# Altium footprint library TranDangKhoa-LIB.PcbLib: 1435 footprints (part 59 of 90)
Each footprint in its own frame and in the unit in brackets; x right, y up, seen from the top. Pads: shape width x height; smd on the part's side, far side on the other; paste and mask are expansions set on the pad; w line width, h text height; cw(c..) or ccw(c..) is an arc to the next point about the centre after c.
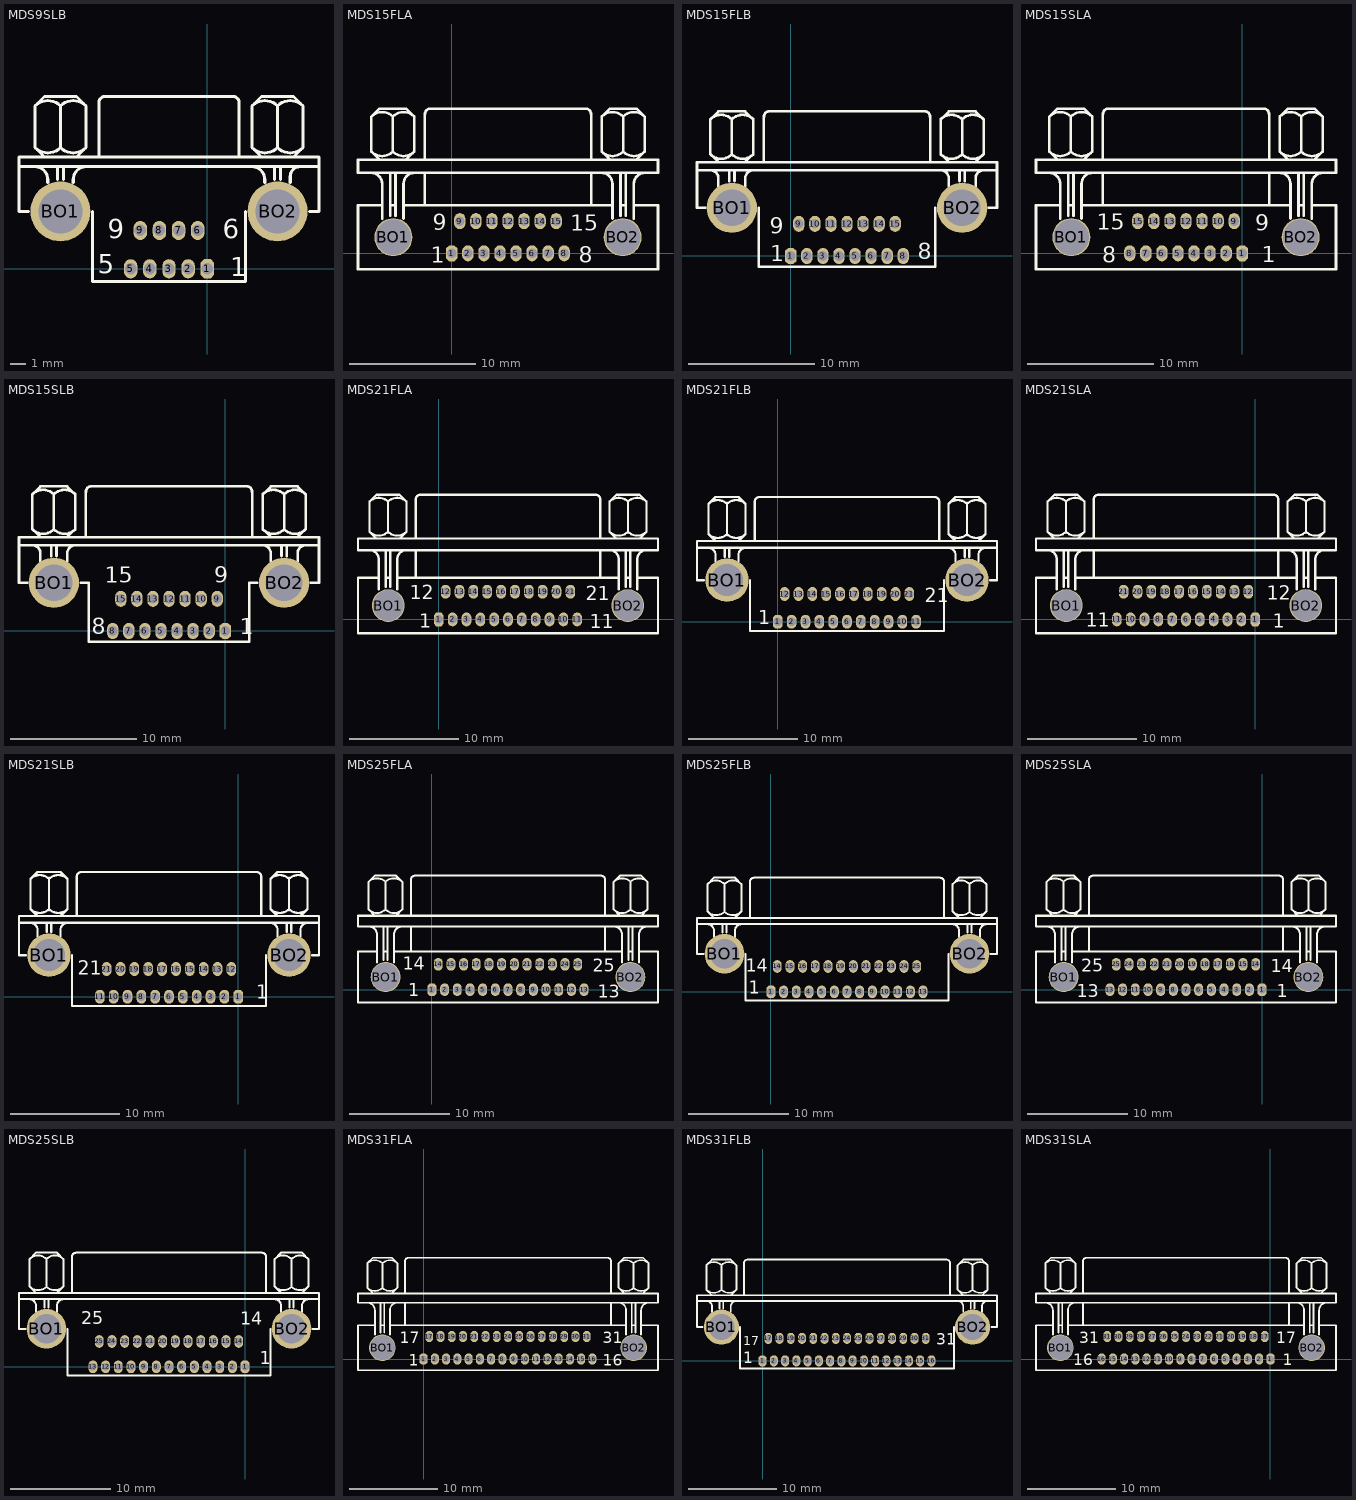
[diagram p58: the footprints below, top view; thin cyan lines are the x and y axes]

## MDS9SLB [mil]
pads (11):
  oct 35x50 hole 30: 1(0,0)
  oval 35x50 hole 30: 2(-50,0) 3(-100,0) 4(-150,0) 5(-200,0) 6(-25,100) 7(-75,100) 8(-125,100) 9(-175,100)
  round 156.67 hole 115: BO1(-383.33,150) BO2(183.33,150)
Top Overlay:
  lines w8: -466.67,150 -491.67,150 -491.67,266.67 ; -450.25,316.41 ccw(c-416.67,350) -383.08,316.41 ; -450.25,425.25 cw(c-416.67,391.67) -383.08,425.25 ; -450,266.67 cw(c-450,233.33) -416.67,233.33 -416.67,225 ; -425,291.67 -450,316.67 -450,425 -425,450 -341.67,450 -316.67,425 -316.67,316.67 -341.67,291.67 ; -391.67,233.33 -391.67,266.67 ; -383.59,316.41 ccw(c-350,350) -316.41,316.41 ; -383.59,425.25 cw(c-350,391.67) -316.41,425.25 ; -383.33,316.67 -383.33,425 ; -375,233.33 -375,266.67 ; -350,225 -350,233.33 cw(c-316.67,233.33) -316.67,266.67 ; -300,150 -300,-33.33 100,-33.33 100,150 ; -283.33,291.67 -283.33,433.33 cw(c-266.67,433.33) -266.67,450 66.67,450 cw(c66.67,433.33) 83.33,433.33 83.33,291.67 75,291.67 ; 116.41,316.41 ccw(c150,350) 183.59,316.41 ; 116.41,425.25 cw(c150,391.67) 183.59,425.25 ; 116.67,266.67 cw(c116.67,233.33) 150,233.33 150,225 ; 141.67,291.67 116.67,316.67 116.67,425 141.67,450 225,450 250,425 250,316.67 225,291.67 ; 175,233.33 175,266.67 ; 183.08,316.41 ccw(c216.67,350) 250.25,316.41 ; 183.08,425.25 cw(c216.67,391.67) 250.25,425.25 ; 183.33,316.67 183.33,425 ; 191.67,233.33 191.67,266.67 ; 216.67,225 216.67,241.67 cw(c241.67,241.67) 241.67,266.67 ; 266.67,150 291.67,150 291.67,266.67 ; -491.67,266.67 291.67,266.67 ; -491.67,266.67 -491.67,291.67 291.67,291.67 291.67,266.67
  text "6" at 40,80 h50
  text "9" at -260,80 h50
  text "1" at 60,-20 h50
  text "5" at -286.05,-11.4 h50

## MDS15FLA [mil]
pads (17):
  oct 35x50 hole 30: 1(0,0)
  oval 35x50 hole 30: 2(50,0) 3(100,0) 4(150,0) 5(200,0) 6(250,0) 7(300,0) 8(350,0) 9(25,100) 10(75,100) 11(125,100) 12(175,100) 13(225,100) 14(275,100) 15(325,100)
  round 118.33 hole 110.83: BO1(-181.67,50) BO2(531.67,50)
Top Overlay:
  lines w8: -250.25,316.41 ccw(c-216.67,350) -183.08,316.41 ; -250.25,425.25 cw(c-216.67,391.67) -183.08,425.25 ; -250,250 cw(c-250,216.67) -216.67,216.67 -216.67,108.33 ; -225,291.67 -250,316.67 -250,425 -225,450 -141.67,450 -116.67,425 -116.67,316.67 -141.67,291.67 ; -216.67,150 -291.67,150 -291.67,-50 641.67,-50 641.67,150 566.67,150 ; -191.67,116.67 -191.67,250 ; -191.67,150 -175,150 ; -183.59,316.41 ccw(c-150,350) -116.41,316.41 ; -183.59,425.25 cw(c-150,391.67) -116.41,425.25 ; -183.33,316.67 -183.33,425 ; -175,116.67 -175,250 ; -150,108.33 -150,216.67 cw(c-116.67,216.67) -116.67,250 ; -150,150 500,150 ; -83.33,150 -83.33,250 ; -83.33,291.67 -83.33,433.33 cw(c-66.67,433.33) -66.67,450 416.67,450 cw(c416.67,433.33) 433.33,433.33 433.33,291.67 425,291.67 ; 433.33,150 433.33,250 ; 466.41,316.41 ccw(c500,350) 533.59,316.41 ; 466.41,425.25 cw(c500,391.67) 533.59,425.25 ; 466.67,250 cw(c466.67,216.67) 500,216.67 500,108.33 ; 491.67,291.67 466.67,316.67 466.67,425 491.67,450 575,450 600,425 600,316.67 575,291.67 ; 525,116.67 525,250 ; 525,150 541.67,150 ; 533.08,316.41 ccw(c566.67,350) 600.25,316.41 ; 533.08,425.25 cw(c566.67,391.67) 600.25,425.25 ; 533.33,316.67 533.33,425 ; 541.67,116.67 541.67,250 ; 566.67,108.33 566.67,216.67 cw(c600,216.67) 600,250 ; -291.67,250 641.67,250 641.67,291.67 -291.67,291.67 -291.67,250
  text "15" at 368.7,69.7 h50
  text "8" at 395,-30 h50
  text "1" at -65,-30 h50
  text "9" at -58.7,72 h50

## MDS15FLB [mil]
pads (17):
  oct 35x50 hole 30: 1(0,0)
  oval 35x50 hole 30: 2(50,0) 3(100,0) 4(150,0) 5(200,0) 6(250,0) 7(300,0) 8(350,0) 9(25,100) 10(75,100) 11(125,100) 12(175,100) 13(225,100) 14(275,100) 15(325,100)
  round 156.67 hole 115: BO1(-183.33,150) BO2(533.33,150)
Top Overlay:
  lines w8: -266.67,150 -291.67,150 -291.67,266.67 ; -250.25,316.41 ccw(c-216.67,350) -183.08,316.41 ; -250.25,425.25 cw(c-216.67,391.67) -183.08,425.25 ; -250,266.67 cw(c-250,241.67) -225,241.67 -225,216.67 ; -225,291.67 -250,316.67 -250,425 -225,450 -141.67,450 -116.67,425 -116.67,316.67 -141.67,291.67 ; -191.67,233.33 -191.67,266.67 ; -183.59,316.41 ccw(c-150,350) -116.41,316.41 ; -183.59,425.25 cw(c-150,391.67) -116.41,425.25 ; -183.33,316.67 -183.33,425 ; -175,233.33 -175,266.67 ; -141.67,216.67 -141.67,241.67 cw(c-116.67,241.67) -116.67,266.67 ; -100,150 -100,-33.33 450,-33.33 450,150 ; -83.33,291.67 -83.33,433.33 cw(c-66.67,433.33) -66.67,450 416.67,450 cw(c416.67,433.33) 433.33,433.33 433.33,291.67 425,291.67 ; 466.41,316.41 ccw(c500,350) 533.59,316.41 ; 466.41,425.25 cw(c500,391.67) 533.59,425.25 ; 466.67,266.67 cw(c466.67,241.67) 491.67,241.67 491.67,216.67 ; 491.67,291.67 466.67,316.67 466.67,425 491.67,450 575,450 600,425 600,316.67 575,291.67 ; 525,233.33 525,266.67 ; 533.08,316.41 ccw(c566.67,350) 600.25,316.41 ; 533.08,425.25 cw(c566.67,391.67) 600.25,425.25 ; 533.33,316.67 533.33,425 ; 541.67,233.33 541.67,266.67 ; 575,216.67 575,241.67 cw(c600,241.67) 600,266.67 ; 616.67,150 641.67,150 641.67,266.67 ; -291.67,266.67 641.67,266.67 ; -291.67,266.67 -291.67,291.67 641.67,291.67 641.67,266.67
  text "8" at 395,-10 h50
  text "1" at -63.5,-16.8 h50
  text "9" at -64.7,69.7 h50

## MDS15SLA [mil]
pads (17):
  oct 35x50 hole 30: 1(0,0)
  oval 35x50 hole 30: 2(-50,0) 3(-100,0) 4(-150,0) 5(-200,0) 6(-250,0) 7(-300,0) 8(-350,0) 9(-25,100) 10(-75,100) 11(-125,100) 12(-175,100) 13(-225,100) 14(-275,100) 15(-325,100)
  round 118.33 hole 110.83: BO1(-531.67,50) BO2(181.67,50)
Top Overlay:
  lines w8: -600.25,316.41 ccw(c-566.67,350) -533.08,316.41 ; -600.25,425.25 cw(c-566.67,391.67) -533.08,425.25 ; -600,250 cw(c-600,216.67) -566.67,216.67 -566.67,108.33 ; -575,291.67 -600,316.67 -600,425 -575,450 -491.67,450 -466.67,425 -466.67,316.67 -491.67,291.67 ; -566.67,150 -641.67,150 -641.67,-50 291.67,-50 291.67,150 216.67,150 ; -541.67,116.67 -541.67,250 ; -541.67,150 -525,150 ; -533.59,316.41 ccw(c-500,350) -466.41,316.41 ; -533.59,425.25 cw(c-500,391.67) -466.41,425.25 ; -533.33,316.67 -533.33,425 ; -525,116.67 -525,250 ; -500,108.33 -500,216.67 cw(c-466.67,216.67) -466.67,250 ; -500,150 150,150 ; -433.33,150 -433.33,250 ; -433.33,291.67 -433.33,433.33 cw(c-416.67,433.33) -416.67,450 66.67,450 cw(c66.67,433.33) 83.33,433.33 83.33,291.67 75,291.67 ; 83.33,150 83.33,250 ; 116.41,316.41 ccw(c150,350) 183.59,316.41 ; 116.41,425.25 cw(c150,391.67) 183.59,425.25 ; 116.67,250 cw(c116.67,216.67) 150,216.67 150,108.33 ; 141.67,291.67 116.67,316.67 116.67,425 141.67,450 225,450 250,425 250,316.67 225,291.67 ; 175,116.67 175,250 ; 175,150 191.67,150 ; 183.08,316.41 ccw(c216.67,350) 250.25,316.41 ; 183.08,425.25 cw(c216.67,391.67) 250.25,425.25 ; 183.33,316.67 183.33,425 ; 191.67,116.67 191.67,250 ; 216.67,108.33 216.67,216.67 cw(c250,216.67) 250,250 ; -641.67,250 -641.67,291.67 291.67,291.67 291.67,250 -641.67,250
  text "15" at -452.5,73.2 h50
  text "8" at -435,-30 h50
  text "1" at 60.2,-28.6 h50
  text "9" at 41.2,69.7 h50

## MDS15SLB [mil]
pads (17):
  oct 35x50 hole 30: 1(0,0)
  oval 35x50 hole 30: 2(-50,0) 3(-100,0) 4(-150,0) 5(-200,0) 6(-250,0) 7(-300,0) 8(-350,0) 9(-25,100) 10(-75,100) 11(-125,100) 12(-175,100) 13(-225,100) 14(-275,100) 15(-325,100)
  round 156.67 hole 115: BO1(-533.33,150) BO2(183.33,150)
Top Overlay:
  lines w8: -616.67,150 -641.67,150 -641.67,266.67 ; -600.25,316.41 ccw(c-566.67,350) -533.08,316.41 ; -600.25,425.25 cw(c-566.67,391.67) -533.08,425.25 ; -600,266.67 cw(c-600,241.67) -575,241.67 -575,216.67 ; -575,291.67 -600,316.67 -600,425 -575,450 -491.67,450 -466.67,425 -466.67,316.67 -491.67,291.67 ; -541.67,233.33 -541.67,266.67 ; -533.59,316.41 ccw(c-500,350) -466.41,316.41 ; -533.59,425.25 cw(c-500,391.67) -466.41,425.25 ; -533.33,316.67 -533.33,425 ; -525,233.33 -525,266.67 ; -491.67,216.67 -491.67,241.67 cw(c-466.67,241.67) -466.67,266.67 ; -450,150 -425,150 -425,-33.33 75,-33.33 75,150 100,150 ; -433.33,291.67 -433.33,433.33 cw(c-416.67,433.33) -416.67,450 66.67,450 cw(c66.67,433.33) 83.33,433.33 83.33,291.67 75,291.67 ; 116.41,316.41 ccw(c150,350) 183.59,316.41 ; 116.41,425.25 cw(c150,391.67) 183.59,425.25 ; 116.67,266.67 cw(c116.67,241.67) 141.67,241.67 141.67,216.67 ; 141.67,291.67 116.67,316.67 116.67,425 141.67,450 225,450 250,425 250,316.67 225,291.67 ; 175,233.33 175,266.67 ; 183.08,316.41 ccw(c216.67,350) 250.25,316.41 ; 183.08,425.25 cw(c216.67,391.67) 250.25,425.25 ; 183.33,316.67 183.33,425 ; 191.67,233.33 191.67,266.67 ; 225,216.67 225,241.67 cw(c250,241.67) 250,266.67 ; 266.67,150 291.67,150 291.67,266.67 ; -641.67,266.67 291.67,266.67 ; -641.67,266.67 -641.67,291.67 291.67,291.67 291.67,266.67
  text "9" at -35,150 h50
  text "1" at 45,-10 h50
  text "8" at -415,-10 h50
  text "15" at -375,150 h50

## MDS21FLA [mil]
pads (23):
  oct 35x50 hole 30: 1(0,0)
  oval 35x50 hole 30: 2(50,0) 3(100,0) 4(150,0) 5(200,0) 6(250,0) 7(300,0) 8(350,0) 9(400,0) 10(450,0) 11(500,0) 12(25,100) 13(75,100) 14(125,100) 15(175,100) 16(225,100) 17(275,100) 18(325,100) 19(375,100) 20(425,100) 21(475,100)
  round 118.33 hole 110.83: BO1(-182.5,50) BO2(682.5,50)
Top Overlay:
  lines w8: -250.25,316.41 ccw(c-216.67,350) -183.08,316.41 ; -250.25,425.25 cw(c-216.67,391.67) -183.08,425.25 ; -250,250 cw(c-250,216.67) -216.67,216.67 -216.67,108.33 ; -225,291.67 -250,316.67 -250,425 -225,450 -141.67,450 -116.67,425 -116.67,316.67 -141.67,291.67 ; -216.67,150 -291.67,150 -291.67,-50 791.67,-50 791.67,150 716.67,150 ; -191.67,116.67 -191.67,250 ; -191.67,150 -175,150 ; -183.59,316.41 ccw(c-150,350) -116.41,316.41 ; -183.59,425.25 cw(c-150,391.67) -116.41,425.25 ; -183.33,316.67 -183.33,425 ; -175,116.67 -175,250 ; -150,108.33 -150,216.67 cw(c-116.67,216.67) -116.67,250 ; -150,150 241.67,150 650,150 ; -83.33,150 -83.33,250 ; -83.33,291.67 -83.33,433.33 cw(c-66.67,433.33) -66.67,450 566.67,450 cw(c566.67,433.33) 583.33,433.33 583.33,291.67 ; 583.33,150 583.33,250 ; 616.41,316.41 ccw(c650,350) 683.59,316.41 ; 616.41,425.25 cw(c650,391.67) 683.59,425.25 ; 616.67,250 cw(c616.67,216.67) 650,216.67 650,108.33 ; 641.67,291.67 616.67,316.67 616.67,425 641.67,450 725,450 750,425 750,316.67 725,291.67 ; 675,116.67 675,250 ; 675,150 691.67,150 ; 683.08,316.41 ccw(c716.67,350) 750.25,316.41 ; 683.08,425.25 cw(c716.67,391.67) 750.25,425.25 ; 683.33,316.67 683.33,425 ; 691.67,116.67 691.67,250 ; 716.67,108.33 716.67,216.67 cw(c750,216.67) 750,250 ; -291.67,250 -291.67,291.67 791.67,291.67 791.67,250 -291.67,250
  text "21" at 530,70 h50
  text "11" at 546,-32.9 h50
  text "1" at -70,-30 h50
  text "12" at -104.7,72.8 h50

## MDS21FLB [mil]
pads (23):
  oct 35x50 hole 30: 1(0,0)
  oval 35x50 hole 30: 2(50,0) 3(100,0) 4(150,0) 5(200,0) 6(250,0) 7(300,0) 8(350,0) 9(400,0) 10(450,0) 11(500,0) 12(25,100) 13(75,100) 14(125,100) 15(175,100) 16(225,100) 17(275,100) 18(325,100) 19(375,100) 20(425,100) 21(475,100)
  round 156.67 hole 115: BO1(-183.33,150) BO2(683.33,150)
Top Overlay:
  lines w8: -266.67,150 -291.67,150 -291.67,266.67 ; -250.25,316.41 ccw(c-216.67,350) -183.08,316.41 ; -250.25,425.25 cw(c-216.67,391.67) -183.08,425.25 ; -250,266.67 cw(c-250,241.67) -225,241.67 -225,216.67 ; -225,291.67 -250,316.67 -250,425 -225,450 -141.67,450 -116.67,425 -116.67,316.67 -141.67,291.67 ; -191.67,233.33 -191.67,266.67 ; -183.59,316.41 ccw(c-150,350) -116.41,316.41 ; -183.59,425.25 cw(c-150,391.67) -116.41,425.25 ; -183.33,316.67 -183.33,425 ; -175,233.33 -175,266.67 ; -141.67,216.67 -141.67,241.67 cw(c-116.67,241.67) -116.67,266.67 ; -100,150 -100,-33.33 600,-33.33 600,150 ; -83.33,291.67 -83.33,433.33 cw(c-66.67,433.33) -66.67,450 566.67,450 cw(c566.67,433.33) 583.33,433.33 583.33,291.67 ; 616.41,316.41 ccw(c650,350) 683.59,316.41 ; 616.41,425.25 cw(c650,391.67) 683.59,425.25 ; 616.67,266.67 cw(c616.67,241.67) 641.67,241.67 641.67,216.67 ; 641.67,291.67 616.67,316.67 616.67,425 641.67,450 725,450 750,425 750,316.67 725,291.67 ; 675,233.33 675,266.67 ; 683.08,316.41 ccw(c716.67,350) 750.25,316.41 ; 683.08,425.25 cw(c716.67,391.67) 750.25,425.25 ; 683.33,316.67 683.33,425 ; 691.67,233.33 691.67,266.67 ; 725,216.67 725,241.67 cw(c750,241.67) 750,266.67 ; 766.67,150 791.67,150 791.67,266.67 ; -291.67,266.67 -291.67,291.67 791.67,291.67 791.67,266.67 ; -291.67,266.67 791.67,266.67
  text "21" at 530,70 h50
  text "1" at -70,-10 h50

## MDS21SLA [mil]
pads (23):
  oct 35x50 hole 30: 1(0,0)
  oval 35x50 hole 30: 2(-50,0) 3(-100,0) 4(-150,0) 5(-200,0) 6(-250,0) 7(-300,0) 8(-350,0) 9(-400,0) 10(-450,0) 11(-500,0) 12(-25,100) 13(-75,100) 14(-125,100) 15(-175,100) 16(-225,100) 17(-275,100) 18(-325,100) 19(-375,100) 20(-425,100) 21(-475,100)
  round 118.33 hole 110.83: BO1(-682.5,50) BO2(182.5,50)
Top Overlay:
  lines w8: -750.25,316.41 ccw(c-716.67,350) -683.08,316.41 ; -750.25,425.25 cw(c-716.67,391.67) -683.08,425.25 ; -750,250 cw(c-750,216.67) -716.67,216.67 -716.67,108.33 ; -725,291.67 -750,316.67 -750,425 -725,450 -641.67,450 -616.67,425 -616.67,316.67 -641.67,291.67 ; -716.67,150 -791.67,150 -791.67,-50 291.67,-50 291.67,150 216.67,150 ; -691.67,116.67 -691.67,250 ; -691.67,150 -675,150 ; -683.59,316.41 ccw(c-650,350) -616.41,316.41 ; -683.59,425.25 cw(c-650,391.67) -616.41,425.25 ; -683.33,316.67 -683.33,425 ; -675,116.67 -675,250 ; -650,108.33 -650,216.67 cw(c-616.67,216.67) -616.67,250 ; -650,150 -241.67,150 150,150 ; -583.33,150 -583.33,250 ; -583.33,291.67 -583.33,433.33 cw(c-566.67,433.33) -566.67,450 66.67,450 cw(c66.67,433.33) 83.33,433.33 83.33,291.67 ; 83.33,150 83.33,250 ; 116.41,316.41 ccw(c150,350) 183.59,316.41 ; 116.41,425.25 cw(c150,391.67) 183.59,425.25 ; 116.67,250 cw(c116.67,216.67) 150,216.67 150,108.33 ; 141.67,291.67 116.67,316.67 116.67,425 141.67,450 225,450 250,425 250,316.67 225,291.67 ; 175,116.67 175,250 ; 175,150 191.67,150 ; 183.08,316.41 ccw(c216.67,350) 250.25,316.41 ; 183.08,425.25 cw(c216.67,391.67) 250.25,425.25 ; 183.33,316.67 183.33,425 ; 191.67,116.67 191.67,250 ; 216.67,108.33 216.67,216.67 cw(c250,216.67) 250,250 ; -791.67,250 -791.67,291.67 291.67,291.67 291.67,250 -791.67,250
  text "12" at 41.9,70.1 h50
  text "1" at 62.5,-30.1 h50
  text "11" at -611.6,-26 h50

## MDS21SLB [mil]
pads (23):
  oct 35x50 hole 30: 1(0,0)
  oval 35x50 hole 30: 2(-50,0) 3(-100,0) 4(-150,0) 5(-200,0) 6(-250,0) 7(-300,0) 8(-350,0) 9(-400,0) 10(-450,0) 11(-500,0) 12(-25,100) 13(-75,100) 14(-125,100) 15(-175,100) 16(-225,100) 17(-275,100) 18(-325,100) 19(-375,100) 20(-425,100) 21(-475,100)
  round 156.67 hole 115: BO1(-683.33,150) BO2(183.33,150)
Top Overlay:
  lines w8: -791.67,266.67 291.67,266.67 ; -766.67,150 -791.67,150 -791.67,291.67 291.67,291.67 291.67,266.67 ; -750.25,316.41 ccw(c-716.67,350) -683.08,316.41 ; -750.25,425.25 cw(c-716.67,391.67) -683.08,425.25 ; -750,266.67 cw(c-750,241.67) -725,241.67 -725,216.67 ; -725,291.67 -750,316.67 -750,425 -725,450 -641.67,450 -616.67,425 -616.67,316.67 -641.67,291.67 ; -691.67,233.33 -691.67,266.67 ; -683.59,316.41 ccw(c-650,350) -616.41,316.41 ; -683.59,425.25 cw(c-650,391.67) -616.41,425.25 ; -683.33,316.67 -683.33,425 ; -675,233.33 -675,266.67 ; -641.67,216.67 -641.67,241.67 cw(c-616.67,241.67) -616.67,266.67 ; -600,150 -600,-33.33 100,-33.33 100,150 ; -583.33,291.67 -583.33,433.33 cw(c-566.67,433.33) -566.67,450 66.67,450 cw(c66.67,433.33) 83.33,433.33 83.33,291.67 ; 116.41,316.41 ccw(c150,350) 183.59,316.41 ; 116.41,425.25 cw(c150,391.67) 183.59,425.25 ; 116.67,266.67 cw(c116.67,241.67) 141.67,241.67 141.67,216.67 ; 141.67,291.67 116.67,316.67 116.67,425 141.67,450 225,450 250,425 250,316.67 225,291.67 ; 175,233.33 175,266.67 ; 183.08,316.41 ccw(c216.67,350) 250.25,316.41 ; 183.08,425.25 cw(c216.67,391.67) 250.25,425.25 ; 183.33,316.67 183.33,425 ; 191.67,233.33 191.67,266.67 ; 225,216.67 225,241.67 cw(c250,241.67) 250,266.67 ; 266.67,150 291.67,150 291.67,266.67
  text "21" at -580,80 h50
  text "1" at 65.2,-8.2 h50

## MDS25FLA [mil]
pads (27):
  oct 35x50 hole 30: 1(0,0)
  oval 35x50 hole 30: 2(50,0) 3(100,0) 4(150,0) 5(200,0) 6(250,0) 7(300,0) 8(350,0) 9(400,0) 10(450,0) 11(500,0) 12(550,0) 13(600,0) 14(25,100) 15(75,100) 16(125,100) 17(175,100) 18(225,100) 19(275,100) 20(325,100) 21(375,100) 22(425,100) 23(475,100) 24(525,100) 25(575,100)
  round 118.33 hole 110.83: BO1(-182.5,50) BO2(782.5,50)
Top Overlay:
  lines w8: -250.25,316.41 ccw(c-216.67,350) -183.08,316.41 ; -250.25,425.25 cw(c-216.67,391.67) -183.08,425.25 ; -250,250 cw(c-250,216.67) -216.67,216.67 -216.67,108.33 ; -225,291.67 -250,316.67 -250,425 -225,450 -141.67,450 -116.67,425 -116.67,316.67 -141.67,291.67 ; -216.67,150 -291.67,150 -291.67,-50 891.67,-50 891.67,150 816.67,150 ; -191.67,116.67 -191.67,250 ; -191.67,150 -175,150 ; -183.59,316.41 ccw(c-150,350) -116.41,316.41 ; -183.59,425.25 cw(c-150,391.67) -116.41,425.25 ; -183.33,316.67 -183.33,425 ; -175,116.67 -175,250 ; -150,108.33 -150,216.67 cw(c-116.67,216.67) -116.67,250 ; -150,150 291.67,150 750,150 ; -83.33,150 -83.33,250 ; -83.33,291.67 -83.33,433.33 cw(c-66.67,433.33) -66.67,450 666.67,450 cw(c666.67,433.33) 683.33,433.33 683.33,291.67 ; 683.33,150 683.33,250 ; 716.41,316.41 ccw(c750,350) 783.59,316.41 ; 716.41,425.25 cw(c750,391.67) 783.59,425.25 ; 716.67,250 cw(c716.67,216.67) 750,216.67 750,108.33 ; 741.67,291.67 716.67,316.67 716.67,425 741.67,450 825,450 850,425 850,316.67 825,291.67 ; 775,116.67 775,250 ; 775,150 791.67,150 ; 783.08,316.41 ccw(c816.67,350) 850.25,316.41 ; 783.08,425.25 cw(c816.67,391.67) 850.25,425.25 ; 783.33,316.67 783.33,425 ; 791.67,116.67 791.67,250 ; 816.67,108.33 816.67,216.67 cw(c850,216.67) 850,250 ; -291.67,250 -291.67,291.67 891.67,291.67 891.67,250 -291.67,250
  text "25" at 634.2,71 h50
  text "13" at 653.6,-30.9 h50
  text "1" at -92.6,-24.9 h50
  text "14" at -115.1,78.5 h50

## MDS25FLB [mil]
pads (27):
  oct 35x50 hole 30: 1(0,0)
  oval 35x50 hole 30: 2(50,0) 3(100,0) 4(150,0) 5(200,0) 6(250,0) 7(300,0) 8(350,0) 9(400,0) 10(450,0) 11(500,0) 12(550,0) 13(600,0) 14(25,100) 15(75,100) 16(125,100) 17(175,100) 18(225,100) 19(275,100) 20(325,100) 21(375,100) 22(425,100) 23(475,100) 24(525,100) 25(575,100)
  round 156.67 hole 115: BO1(-183.33,150) BO2(783.33,150)
Top Overlay:
  lines w8: -266.67,150 -291.67,150 -291.67,266.67 ; -250.25,316.41 ccw(c-216.67,350) -183.08,316.41 ; -250.25,425.25 cw(c-216.67,391.67) -183.08,425.25 ; -250,266.67 cw(c-250,241.67) -225,241.67 -225,216.67 ; -225,291.67 -250,316.67 -250,425 -225,450 -141.67,450 -116.67,425 -116.67,316.67 -141.67,291.67 ; -191.67,233.33 -191.67,266.67 ; -183.59,316.41 ccw(c-150,350) -116.41,316.41 ; -183.59,425.25 cw(c-150,391.67) -116.41,425.25 ; -183.33,316.67 -183.33,425 ; -175,233.33 -175,266.67 ; -141.67,216.67 -141.67,241.67 cw(c-116.67,241.67) -116.67,266.67 ; -100,150 -100,-33.33 700,-33.33 700,150 ; -83.33,291.67 -83.33,433.33 cw(c-66.67,433.33) -66.67,450 666.67,450 cw(c666.67,433.33) 683.33,433.33 683.33,291.67 ; 716.41,316.41 ccw(c750,350) 783.59,316.41 ; 716.41,425.25 cw(c750,391.67) 783.59,425.25 ; 716.67,266.67 cw(c716.67,241.67) 741.67,241.67 741.67,216.67 ; 741.67,291.67 716.67,316.67 716.67,425 741.67,450 825,450 850,425 850,316.67 825,291.67 ; 775,233.33 775,266.67 ; 783.08,316.41 ccw(c816.67,350) 850.25,316.41 ; 783.08,425.25 cw(c816.67,391.67) 850.25,425.25 ; 783.33,316.67 783.33,425 ; 791.67,233.33 791.67,266.67 ; 825,216.67 825,241.67 cw(c850,241.67) 850,266.67 ; 866.67,150 891.67,150 891.67,266.67 ; -291.67,266.67 891.67,266.67 ; -291.67,266.67 -291.67,291.67 891.67,291.67 891.67,266.67
  text "14" at -100,80 h50
  text "1" at -88.1,-7 h50

## MDS25SLA [mil]
pads (27):
  oct 35x50 hole 30: 1(0,0)
  oval 35x50 hole 30: 2(-50,0) 3(-100,0) 4(-150,0) 5(-200,0) 6(-250,0) 7(-300,0) 8(-350,0) 9(-400,0) 10(-450,0) 11(-500,0) 12(-550,0) 13(-600,0) 14(-25,100) 15(-75,100) 16(-125,100) 17(-175,100) 18(-225,100) 19(-275,100) 20(-325,100) 21(-375,100) 22(-425,100) 23(-475,100) 24(-525,100) 25(-575,100)
  round 118.33 hole 110.83: BO1(-782.5,50) BO2(182.5,50)
Top Overlay:
  lines w8: -850.25,316.41 ccw(c-816.67,350) -783.08,316.41 ; -850.25,425.25 cw(c-816.67,391.67) -783.08,425.25 ; -850,250 cw(c-850,216.67) -816.67,216.67 -816.67,108.33 ; -825,291.67 -850,316.67 -850,425 -825,450 -741.67,450 -716.67,425 -716.67,316.67 -741.67,291.67 ; -816.67,150 -891.67,150 -891.67,-50 291.67,-50 291.67,150 216.67,150 ; -791.67,116.67 -791.67,250 ; -791.67,150 -775,150 ; -783.59,316.41 ccw(c-750,350) -716.41,316.41 ; -783.59,425.25 cw(c-750,391.67) -716.41,425.25 ; -783.33,316.67 -783.33,425 ; -775,116.67 -775,250 ; -750,108.33 -750,216.67 cw(c-716.67,216.67) -716.67,250 ; -750,150 -283.33,150 150,150 ; -683.33,150 -683.33,250 ; -683.33,291.67 -683.33,433.33 cw(c-666.67,433.33) -666.67,450 66.67,450 cw(c66.67,433.33) 83.33,433.33 83.33,291.67 ; 83.33,150 83.33,250 ; 116.41,316.41 ccw(c150,350) 183.59,316.41 ; 116.41,425.25 cw(c150,391.67) 183.59,425.25 ; 116.67,250 cw(c116.67,216.67) 150,216.67 150,108.33 ; 141.67,291.67 116.67,316.67 116.67,425 141.67,450 225,450 250,425 250,316.67 225,291.67 ; 175,116.67 175,250 ; 175,150 191.67,150 ; 183.08,316.41 ccw(c216.67,350) 250.25,316.41 ; 183.08,425.25 cw(c216.67,391.67) 250.25,425.25 ; 183.33,316.67 183.33,425 ; 191.67,116.67 191.67,250 ; 216.67,108.33 216.67,216.67 cw(c250,216.67) 250,250 ; -891.67,250 -891.67,291.67 291.67,291.67 291.67,250 -891.67,250
  text "25" at -713.6,71 h50
  text "13" at -730.1,-29.4 h50
  text "1" at 58.1,-29.4 h50
  text "14" at 34.2,69.5 h50

## MDS25SLB [mil]
pads (27):
  oct 35x50 hole 30: 1(0,0)
  oval 35x50 hole 30: 2(-50,0) 3(-100,0) 4(-150,0) 5(-200,0) 6(-250,0) 7(-300,0) 8(-350,0) 9(-400,0) 10(-450,0) 11(-500,0) 12(-550,0) 13(-600,0) 14(-25,100) 15(-75,100) 16(-125,100) 17(-175,100) 18(-225,100) 19(-275,100) 20(-325,100) 21(-375,100) 22(-425,100) 23(-475,100) 24(-525,100) 25(-575,100)
  round 156.67 hole 115: BO1(-783.33,150) BO2(183.33,150)
Top Overlay:
  lines w8: -866.67,150 -891.67,150 -891.67,266.67 ; -850.25,316.41 ccw(c-816.67,350) -783.08,316.41 ; -850.25,425.25 cw(c-816.67,391.67) -783.08,425.25 ; -850,266.67 cw(c-850,241.67) -825,241.67 -825,216.67 ; -825,291.67 -850,316.67 -850,425 -825,450 -741.67,450 -716.67,425 -716.67,316.67 -741.67,291.67 ; -791.67,233.33 -791.67,266.67 ; -783.59,316.41 ccw(c-750,350) -716.41,316.41 ; -783.59,425.25 cw(c-750,391.67) -716.41,425.25 ; -783.33,316.67 -783.33,425 ; -775,233.33 -775,266.67 ; -741.67,216.67 -741.67,241.67 cw(c-716.67,241.67) -716.67,266.67 ; -700,150 -700,-33.33 100,-33.33 100,150 ; -683.33,291.67 -683.33,433.33 cw(c-666.67,433.33) -666.67,450 66.67,450 cw(c66.67,433.33) 83.33,433.33 83.33,291.67 ; 116.41,316.41 ccw(c150,350) 183.59,316.41 ; 116.41,425.25 cw(c150,391.67) 183.59,425.25 ; 116.67,266.67 cw(c116.67,241.67) 141.67,241.67 141.67,216.67 ; 141.67,291.67 116.67,316.67 116.67,425 141.67,450 225,450 250,425 250,316.67 225,291.67 ; 175,233.33 175,266.67 ; 183.08,316.41 ccw(c216.67,350) 250.25,316.41 ; 183.08,425.25 cw(c216.67,391.67) 250.25,425.25 ; 183.33,316.67 183.33,425 ; 191.67,233.33 191.67,266.67 ; 225,216.67 225,241.67 cw(c250,241.67) 250,266.67 ; 266.67,150 291.67,150 291.67,266.67 ; -891.67,266.67 291.67,266.67 ; -891.67,266.67 -891.67,291.67 291.67,291.67 291.67,266.67
  text "25" at -646.2,168.4 h50
  text "1" at 58.1,9.5 h50
  text "14" at -18.3,165.4 h50

## MDS31FLA [mil]
pads (33):
  oct 35x50 hole 30: 1(0,0)
  oval 35x50 hole 30: 2(50,0) 3(100,0) 4(150,0) 5(200,0) 6(250,0) 7(300,0) 8(350,0) 9(400,0) 10(450,0) 11(500,0) 12(550,0) 13(600,0) 14(650,0) 15(700,0) 16(750,0) 17(25,100) 18(75,100) 19(125,100) 20(175,100) 21(225,100) 22(275,100) 23(325,100) 24(375,100) 25(425,100) 26(475,100) 27(525,100) 28(575,100) 29(625,100) 30(675,100) 31(725,100)
  round 118.33 hole 110.83: BO1(-183.33,50) BO2(933.33,50)
Top Overlay:
  lines w8: -250.25,316.41 ccw(c-216.67,350) -183.08,316.41 ; -250.25,425.25 cw(c-216.67,391.67) -183.08,425.25 ; -250,250 cw(c-250,216.67) -216.67,216.67 -216.67,108.33 ; -225,291.67 -250,316.67 -250,425 -225,450 -141.67,450 -116.67,425 -116.67,316.67 -141.67,291.67 ; -216.67,150 -291.67,150 -291.67,-50 1041.67,-50 1041.67,150 966.67,150 ; -191.67,116.67 -191.67,250 ; -191.67,150 -175,150 ; -183.59,316.41 ccw(c-150,350) -116.41,316.41 ; -183.59,425.25 cw(c-150,391.67) -116.41,425.25 ; -183.33,316.67 -183.33,425 ; -175,116.67 -175,250 ; -150,108.33 -150,216.67 cw(c-116.67,216.67) -116.67,250 ; -150,150 408.33,150 900,150 ; -83.33,150 -83.33,250 ; -83.33,291.67 -83.33,433.33 cw(c-66.67,433.33) -66.67,450 816.67,450 cw(c816.67,433.33) 833.33,433.33 833.33,291.67 ; 833.33,150 833.33,250 ; 866.41,316.41 ccw(c900,350) 933.59,316.41 ; 866.41,425.25 cw(c900,391.67) 933.59,425.25 ; 866.67,250 cw(c866.67,216.67) 900,216.67 900,108.33 ; 891.67,291.67 866.67,316.67 866.67,425 891.67,450 975,450 1000,425 1000,316.67 975,291.67 ; 925,116.67 925,250 ; 925,150 941.67,150 ; 933.08,316.41 ccw(c966.67,350) 1000.25,316.41 ; 933.08,425.25 cw(c966.67,391.67) 1000.25,425.25 ; 933.33,316.67 933.33,425 ; 941.67,116.67 941.67,250 ; 966.67,108.33 966.67,216.67 cw(c1000,216.67) 1000,250 ; -291.67,250 -291.67,291.67 1041.67,291.67 1041.67,250 -291.67,250
  text "17" at -105,70 h50
  text "1" at -65,-30 h50
  text "16" at 795,-30 h50
  text "31" at 795,70 h50

## MDS31FLB [mil]
pads (33):
  oct 35x50 hole 30: 1(0,0)
  oval 35x50 hole 30: 2(50,0) 3(100,0) 4(150,0) 5(200,0) 6(250,0) 7(300,0) 8(350,0) 9(400,0) 10(450,0) 11(500,0) 12(550,0) 13(600,0) 14(650,0) 15(700,0) 16(750,0) 17(25,100) 18(75,100) 19(125,100) 20(175,100) 21(225,100) 22(275,100) 23(325,100) 24(375,100) 25(425,100) 26(475,100) 27(525,100) 28(575,100) 29(625,100) 30(675,100) 31(725,100)
  round 156.67 hole 115: BO1(-183.33,150) BO2(933.33,150)
Top Overlay:
  lines w8: -266.67,150 -291.67,150 -291.67,266.67 ; -250.25,316.41 ccw(c-216.67,350) -183.08,316.41 ; -250.25,425.25 cw(c-216.67,391.67) -183.08,425.25 ; -250,266.67 cw(c-250,241.67) -225,241.67 -225,216.67 ; -225,291.67 -250,316.67 -250,425 -225,450 -141.67,450 -116.67,425 -116.67,316.67 -141.67,291.67 ; -191.67,233.33 -191.67,266.67 ; -183.59,316.41 ccw(c-150,350) -116.41,316.41 ; -183.59,425.25 cw(c-150,391.67) -116.41,425.25 ; -183.33,316.67 -183.33,425 ; -175,233.33 -175,266.67 ; -141.67,216.67 -141.67,241.67 cw(c-116.67,241.67) -116.67,266.67 ; -100,150 -100,-33.33 850,-33.33 850,150 ; -83.33,291.67 -83.33,433.33 cw(c-66.67,433.33) -66.67,450 816.67,450 cw(c816.67,433.33) 833.33,433.33 833.33,291.67 ; 866.41,316.41 ccw(c900,350) 933.59,316.41 ; 866.41,425.25 cw(c900,391.67) 933.59,425.25 ; 866.67,266.67 cw(c866.67,241.67) 891.67,241.67 891.67,216.67 ; 891.67,291.67 866.67,316.67 866.67,425 891.67,450 975,450 1000,425 1000,316.67 975,291.67 ; 925,233.33 925,266.67 ; 933.08,316.41 ccw(c966.67,350) 1000.25,316.41 ; 933.08,425.25 cw(c966.67,391.67) 1000.25,425.25 ; 933.33,316.67 933.33,425 ; 941.67,233.33 941.67,266.67 ; 975,216.67 975,241.67 cw(c1000,241.67) 1000,266.67 ; 1016.67,150 1041.67,150 1041.67,266.67 ; -291.67,266.67 -291.67,291.67 1041.67,291.67 1041.67,266.67 ; -291.67,266.67 1041.67,266.67
  text "17" at -85,70 h40
  text "1" at -85,-10 h50
  text "31" at 772,70.7 h50

## MDS31SLA [mil]
pads (33):
  oct 35x50 hole 30: 1(0,0)
  oval 35x50 hole 30: 2(-50,0) 3(-100,0) 4(-150,0) 5(-200,0) 6(-250,0) 7(-300,0) 8(-350,0) 9(-400,0) 10(-450,0) 11(-500,0) 12(-550,0) 13(-600,0) 14(-650,0) 15(-700,0) 16(-750,0) 17(-25,100) 18(-75,100) 19(-125,100) 20(-175,100) 21(-225,100) 22(-275,100) 23(-325,100) 24(-375,100) 25(-425,100) 26(-475,100) 27(-525,100) 28(-575,100) 29(-625,100) 30(-675,100) 31(-725,100)
  round 118.33 hole 110.83: BO1(-933.33,50) BO2(183.33,50)
Top Overlay:
  lines w8: -1000.25,316.41 ccw(c-966.67,350) -933.08,316.41 ; -1000.25,425.25 cw(c-966.67,391.67) -933.08,425.25 ; -1000,250 cw(c-1000,216.67) -966.67,216.67 -966.67,108.33 ; -975,291.67 -1000,316.67 -1000,425 -975,450 -891.67,450 -866.67,425 -866.67,316.67 -891.67,291.67 ; -966.67,150 -1041.67,150 -1041.67,-50 283.33,-50 291.67,-50 291.67,150 216.67,150 ; -941.67,116.67 -941.67,250 ; -941.67,150 -925,150 ; -933.59,316.41 ccw(c-900,350) -866.41,316.41 ; -933.59,425.25 cw(c-900,391.67) -866.41,425.25 ; -933.33,316.67 -933.33,425 ; -925,116.67 -925,250 ; -900,108.33 -900,216.67 cw(c-866.67,216.67) -866.67,250 ; -900,150 -408.33,150 150,150 ; -833.33,150 -833.33,250 ; -833.33,291.67 -833.33,433.33 cw(c-816.67,433.33) -816.67,450 66.67,450 cw(c66.67,433.33) 83.33,433.33 83.33,291.67 ; 83.33,150 83.33,250 ; 116.41,316.41 ccw(c150,350) 183.59,316.41 ; 116.41,425.25 cw(c150,391.67) 183.59,425.25 ; 116.67,250 cw(c116.67,216.67) 150,216.67 150,108.33 ; 141.67,291.67 116.67,316.67 116.67,425 141.67,450 225,450 250,425 250,316.67 225,291.67 ; 175,116.67 175,250 ; 175,150 191.67,150 ; 183.08,316.41 ccw(c216.67,350) 250.25,316.41 ; 183.08,425.25 cw(c216.67,391.67) 250.25,425.25 ; 183.33,316.67 183.33,425 ; 191.67,116.67 191.67,250 ; 216.67,108.33 216.67,216.67 cw(c250,216.67) 250,250 ; -1041.67,250 291.67,250 291.67,291.67 -1041.67,291.67 -1041.67,250
  text "17" at 25,70 h50
  text "1" at 55.7,-28.8 h50
  text "16" at -875.6,-28.8 h50
  text "31" at -850.3,70.7 h50